# Altium footprint library PcbLibLafe.PcbLib: 294 footprints (part 17 of 19)
Each footprint in its own frame and in the unit in brackets; x right, y up, seen from the top. Pads: shape width x height; smd on the part's side, far side on the other; paste and mask are expansions set on the pad; w line width, h text height; cw(c..) or ccw(c..) is an arc to the next point about the centre after c.
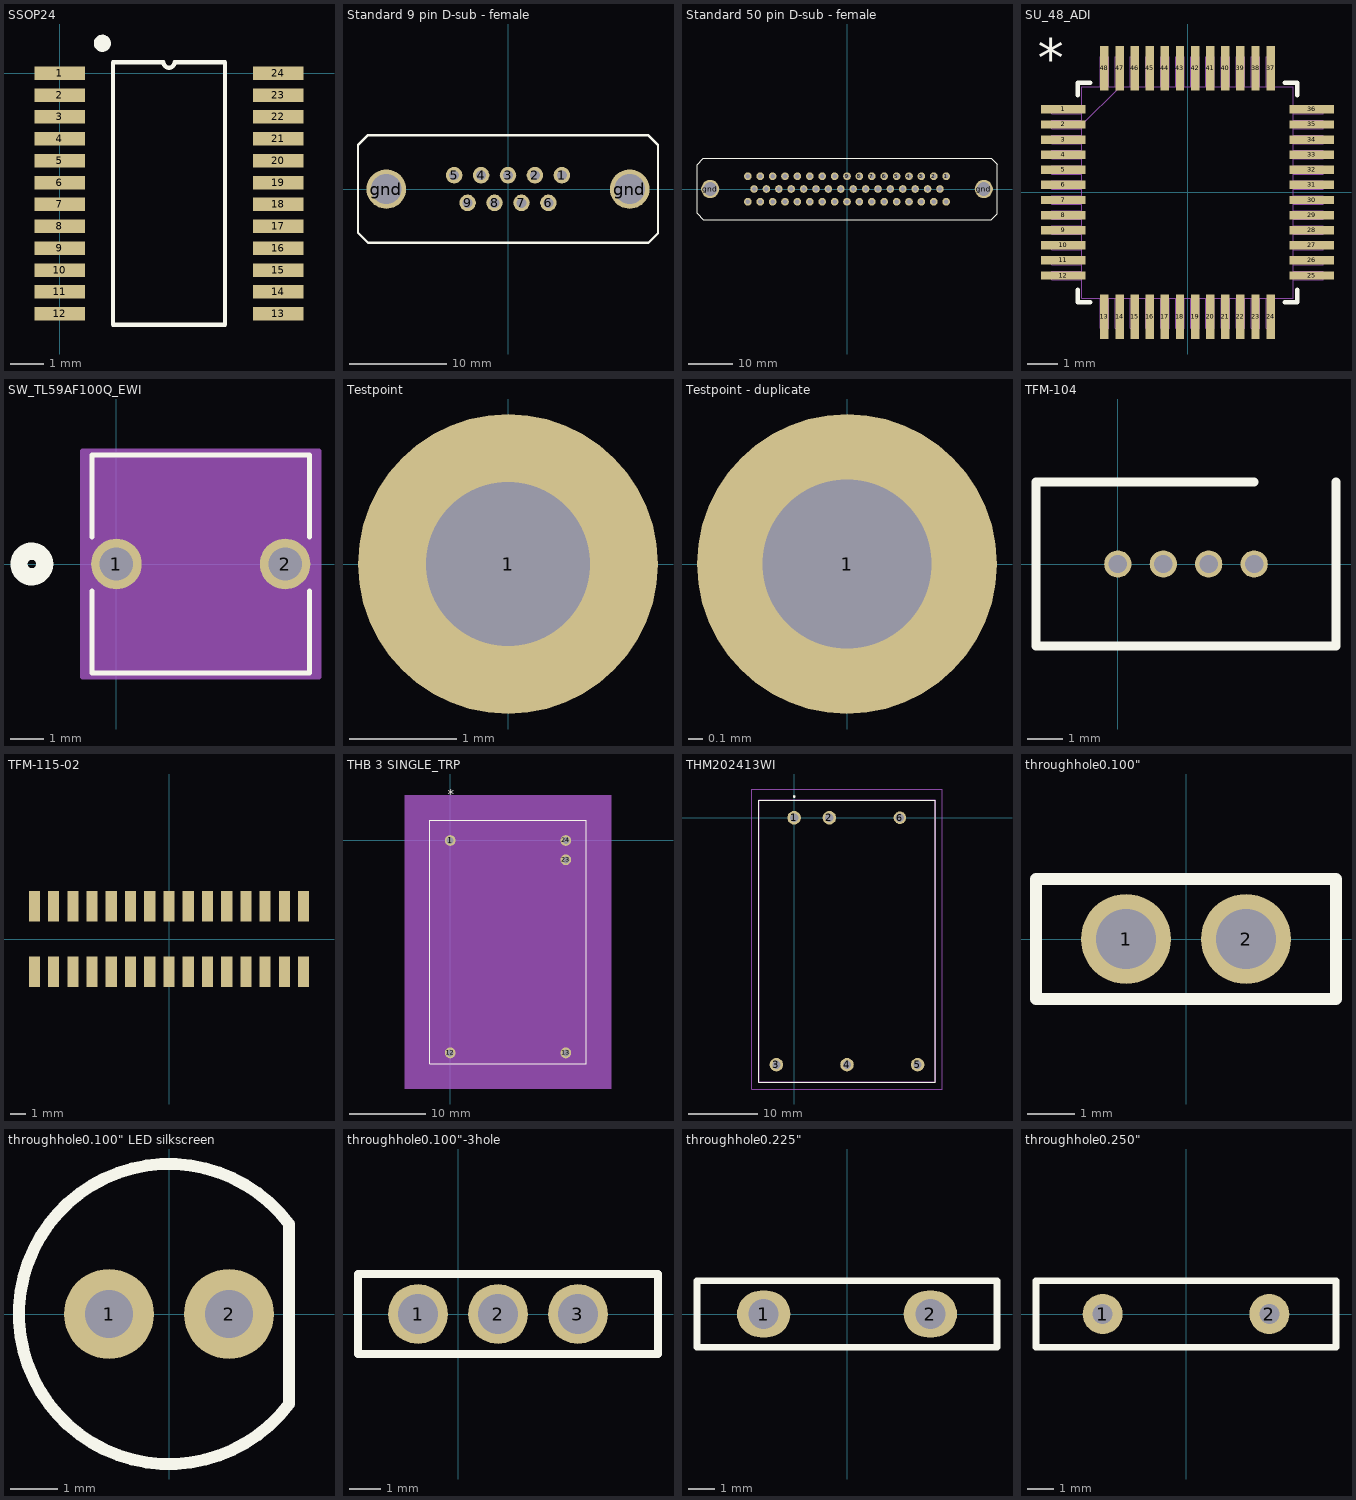
[diagram p16: the footprints below, top view; thin cyan lines are the x and y axes]

## SSOP24 [mm]
pads (24):
  rect 1.5x0.4 smd: 1(0,0) 2(0,-0.65) 3(0,-1.3) 4(0,-1.95) 5(0,-2.6) 6(0,-3.25) 7(0,-3.9) 8(0,-4.55) 9(0,-5.2) 10(0,-5.85) 11(0,-6.5) 12(0,-7.15) 13(6.5,-7.15) 14(6.5,-6.5) 15(6.5,-5.85) 16(6.5,-5.2) 17(6.5,-4.55) 18(6.5,-3.9) 19(6.5,-3.25) 20(6.5,-2.6) 21(6.5,-1.95) 22(6.5,-1.3) 23(6.5,-0.65) 24(6.5,0)
Top Overlay:
  circle w0.254: c1.27,0.889 r0.127
  lines w0.127: 1.585,-7.475 1.585,0.325 3.087,0.325 ccw(c3.25,0.325) 3.412,0.325 4.915,0.325 4.915,-7.475 1.585,-7.475
3D body: height 1.52, standoff 0.25, extent 1.067,-7.544 5.385,0.356
3D body: height 0.51, standoff 0, extent -0.076,-0.191 0.61,0.191
3D body: height 0.89, standoff 0.38, extent 0.267,-0.191 1.092,0.191
3D body: height 0.89, standoff 0.38, extent 0.267,-1.486 1.092,-1.105
3D body: height 0.51, standoff 0, extent -0.076,-1.486 0.61,-1.105
3D body: height 0.89, standoff 0.38, extent 5.359,-1.46 6.185,-1.079
3D body: height 0.51, standoff 0, extent 5.842,-1.46 6.528,-1.079
3D body: height 0.89, standoff 0.38, extent 5.359,-0.165 6.185,0.216
3D body: height 0.51, standoff 0, extent 5.842,-0.165 6.528,0.216
3D body: height 1.55, standoff 1.52, extent 1.346,-0.405 1.852,0.102
3D body: height 1.55, standoff 1.52, extent 2.159,-0.864 4.293,0
3D body: height 0.51, standoff 0, extent 5.842,-2.781 6.528,-2.4
3D body: height 0.89, standoff 0.38, extent 5.359,-2.781 6.185,-2.4
3D body: height 0.51, standoff 0, extent -0.076,-2.807 0.61,-2.426
3D body: height 0.89, standoff 0.38, extent 0.267,-2.807 1.092,-2.426
3D body: height 0.51, standoff 0, extent 5.842,-4.051 6.528,-3.67
3D body: height 0.89, standoff 0.38, extent 5.359,-4.051 6.185,-3.67
3D body: height 0.51, standoff 0, extent -0.076,-4.077 0.61,-3.696
3D body: height 0.89, standoff 0.38, extent 0.267,-4.077 1.092,-3.696
3D body: height 0.51, standoff 0, extent 5.842,-5.372 6.528,-4.991
3D body: height 0.89, standoff 0.38, extent 5.359,-5.372 6.185,-4.991
3D body: height 0.51, standoff 0, extent -0.076,-5.397 0.61,-5.016
3D body: height 0.89, standoff 0.38, extent 0.267,-5.397 1.092,-5.016
3D body: height 0.51, standoff 0, extent 5.842,-6.667 6.528,-6.286
3D body: height 0.89, standoff 0.38, extent 5.359,-6.667 6.185,-6.286
3D body: height 0.51, standoff 0, extent -0.076,-6.693 0.61,-6.312
3D body: height 0.89, standoff 0.38, extent 0.267,-6.693 1.092,-6.312
3D body: height 0.51, standoff 0, extent 5.842,-7.302 6.528,-6.921
3D body: height 0.89, standoff 0.38, extent 5.359,-7.302 6.185,-6.921
3D body: height 0.51, standoff 0, extent -0.076,-7.328 0.61,-6.947
3D body: height 0.89, standoff 0.38, extent 0.267,-7.328 1.092,-6.947
3D body: height 0.51, standoff 0, extent 5.842,-6.007 6.528,-5.626
3D body: height 0.89, standoff 0.38, extent 5.359,-6.007 6.185,-5.626
3D body: height 0.51, standoff 0, extent -0.076,-6.032 0.61,-5.651
3D body: height 0.89, standoff 0.38, extent 0.267,-6.032 1.092,-5.651
3D body: height 0.51, standoff 0, extent 5.867,-4.712 6.553,-4.331
3D body: height 0.89, standoff 0.38, extent 5.385,-4.712 6.21,-4.331
3D body: height 0.51, standoff 0, extent -0.051,-4.737 0.635,-4.356
3D body: height 0.89, standoff 0.38, extent 0.292,-4.737 1.118,-4.356
3D body: height 0.51, standoff 0, extent 5.867,-3.416 6.553,-3.035
3D body: height 0.89, standoff 0.38, extent 5.385,-3.416 6.21,-3.035
3D body: height 0.51, standoff 0, extent -0.051,-3.442 0.635,-3.061
3D body: height 0.89, standoff 0.38, extent 0.292,-3.442 1.118,-3.061
3D body: height 0.51, standoff 0, extent 5.817,-2.121 6.502,-1.74
3D body: height 0.89, standoff 0.38, extent 5.334,-2.121 6.159,-1.74
3D body: height 0.51, standoff 0, extent -0.102,-2.146 0.584,-1.765
3D body: height 0.89, standoff 0.38, extent 0.241,-2.146 1.067,-1.765
3D body: height 0.51, standoff 0, extent 5.817,-0.851 6.502,-0.47
3D body: height 0.89, standoff 0.38, extent 5.334,-0.851 6.159,-0.47
3D body: height 0.51, standoff 0, extent -0.102,-0.876 0.584,-0.495
3D body: height 0.89, standoff 0.38, extent 0.241,-0.876 1.067,-0.495

## Standard 9 pin D-sub - female [mil] "NorComp 172-E09-213R911"
height 400
pads (11):
  round 67 hole 40: 1(218,56) 2(109,56) 3(0,56) 4(-109,56) 5(-218,56) 6(163.5,-56) 7(54.5,-56) 8(-54.5,-56) 9(-163.5,-56)
  round 160 hole 122: gnd(-492,0) gnd(492,0)
Top Overlay:
  lines w10: -606.5,-176.5 -606.5,178.5 -566.5,218.5 565.5,218.5 606.5,177.5 606.5,-178.5 567,-218 -565,-218 -606.5,-176.5
3D body "172-E09-213.STEP": height 242, standoff -443.5, extent -605,-250 608,246

## Standard 50 pin D-sub - female [mil] "NorComp 172-E50-213R911"
height 400
pads (52):
  round 67 hole 40: 1(872,112) 2(763,112) 3(654,112) 4(545,112) 5(436,112) 6(327,112) 7(218,112) 8(109,112) 9(0,112) 10(-109,112) 11(-218,112) 12(-327,112) 13(-436,112) 14(-545,112) 15(-654,112) 16(-763,112) 17(-872,112) 18(817.5,0) 19(708.5,0) 20(599.5,0) 21(490.5,0) 22(381.5,0) 23(272.5,0) 24(163.5,0) 25(54.5,0) 26(-54.5,0) 27(-163.5,0) 28(-272.5,0) 29(-381.5,0) 30(-490.5,0) 31(-599.5,0) 32(-708.5,0) 33(-817.5,0) 34(872,-112) 35(763,-112) 36(654,-112) 37(545,-112) 38(436,-112) 39(327,-112) 40(218,-112) 41(109,-112) 42(0,-112) 43(-109,-112) 44(-218,-112) 45(-327,-112) 46(-436,-112) 47(-545,-112) 48(-654,-112) 49(-763,-112) 50(-872,-112)
  round 160 hole 122: gnd(-1203,0) gnd(1203,0)
Top Overlay:
  lines w10: -1319,-215 -1265.5,-268.5 1267.5,-268.5 1319,-217 1319,219 1269.5,268.5 -1263.5,268.5 -1319,213 -1319,-215
3D body "172-E50-213.STEP": height 242, standoff -443.5, extent -1323,-298 1315,304

## SU_48_ADI [mil]
pads (48):
  rect 58x11 smd paste+0 mask+0: 1(-162,108.27) 2(-162,88.58) 3(-162,68.9) 4(-162,49.21) 5(-162,29.53) 6(-162,9.84) 7(-162,-9.84) 8(-162,-29.53) 9(-162,-49.21) 10(-162,-68.9) 11(-162,-88.58) 12(-162,-108.27) 25(162,-108.27) 26(162,-88.58) 27(162,-68.9) 28(162,-49.21) 29(162,-29.53) 30(162,-9.84) 31(162,9.84) 32(162,29.53) 33(162,49.21) 34(162,68.9) 35(162,88.58) 36(162,108.27)
  rect 11x58 smd paste+0 mask+0: 13(-108.27,-162) 14(-88.58,-162) 15(-68.9,-162) 16(-49.21,-162) 17(-29.53,-162) 18(-9.84,-162) 19(9.84,-162) 20(29.53,-162) 21(49.21,-162) 22(68.9,-162) 23(88.58,-162) 24(108.27,-162) 37(108.27,162) 38(88.58,162) 39(68.9,162) 40(49.21,162) 41(29.53,162) 42(9.84,162) 43(-9.84,162) 44(-29.53,162) 45(-49.21,162) 46(-68.9,162) 47(-88.58,162) 48(-108.27,162)
Top Overlay:
  lines w6: -143,-126.87 -143,-143 -126.87,-143 ; -143,126.87 -143,143 -126.87,143 ; 126.87,-143 143,-143 143,-126.87 ; 126.87,143 143,143 143,126.87
  text "*" at -195,150 h50
Mechanical 13:
  drawing of 197 lines, arcs and shapes, not listed
3D body "SU_48_ADI.step": height 47.09, standoff 0, extent -177,-177 177.01,177.01
3D body: height 10, standoff 0, extent 0,0 10,10

## SW_TL59AF100Q_EWI [mil]
pads (2):
  round 59 / inner round 60 / far side round 59 hole 39 paste-99999 mask+0: 1(0,0) 2(196.85,0)
Top Overlay:
  circle w20: c-98.57,0 r15
  lines w6: -28.57,-31.59 -28.57,-127 225.43,-127 225.43,-31.59 ; -28.57,31.59 -28.57,127 225.43,127 225.43,31.59
Bottom Overlay:
  circle w20: c-98.57,0 r15
Mechanical 13:
  circle w20: c0,75 r15
  lines w1: -23.57,-122 -23.57,122 220.43,122 220.43,-122 -23.57,-122
Mechanical 15:
  region: 236.35,132 -39.5,132 -39.5,-132 236.35,-132
  lines w6: -39.5,-132 236.35,-132 236.35,132 -39.5,132 -39.5,-132
3D body "TL59AF100Q.STEP": height 202.44, standoff -529.84, extent -24.09,-122.05 220,122.05

## Testpoint [mil] "testpoint"
pads (1):
  round 110 hole 60: 1(0,0)

## Testpoint - duplicate [mil] "testpoint"
pads (1):
  round 80 hole 45: 1(0,0)
3D body "keystone-PN5000.STEP": height 90, standoff -210, extent -49.99,-49.99 50.01,50.01

## TFM-104 [mil] "Samtec 4 pin thru hole"
pads (4):
  round 30 hole 20: ""(0,0) ""(50,0) ""(100,0) ""(150,0)
Top Overlay:
  lines w10: 150,90 -90,90 -90,-90 240,-90 240,90

## TFM-115-02 [mil] "Samtec 30 pin surface mount"
pads (30):
  rect 29x80 smd: ""(-350,-85) ""(-350,85) ""(-300,-85) ""(-300,85) ""(-250,-85) ""(-250,85) ""(-200,-85) ""(-200,85) ""(-150,-85) ""(-150,85) ""(-100,-85) ""(-100,85) ""(-50,-85) ""(-50,85) ""(0,-85) ""(0,85) ""(50,-85) ""(50,85) ""(100,-85) ""(100,85) ""(150,-85) ""(150,85) ""(200,-85) ""(200,85) ""(250,-85) ""(250,85) ""(300,-85) ""(300,85) ""(350,-85) ""(350,85)

## THB 3 SINGLE_TRP [mil]
pads (5):
  round 56 hole 36 mask+0: 1(0,0) 12(0,-1100) 13(598.43,-1100) 23(598.43,-100) 24(598.43,0)
Top Overlay:
  lines w6: -105.29,-1157 703.71,-1157 703.71,105 -105.29,105 -105.29,-1157
  text "*" at -12.5,216.67 h50
Mechanical 5:
  region: 833.71,-1287 -235.29,-1287 -235.29,235 833.71,235
Mechanical 13:
  lines w0: 287.21,100 ccw(c299.21,100) 311.21,100
  lines w1: -100.29,-1152 698.71,-1152 698.71,100 -100.29,100 -100.29,-1152
  text "*" at -12.5,16.67 h50
Mechanical 15:
  region: 708.71,-1162 -110.29,-1162 -110.29,110 708.71,110
  region: 698.71,-1152 -100.29,-1152 -100.29,100 698.71,100
  lines w6: -110.29,-1162 -110.29,110 708.71,110 708.71,-1162 -110.29,-1162
3D body "thb3_single_3d_drawing.stp": height 413.51, standoff -153.42, extent -99.21,-1176.97 700,75
3D body: height 10, standoff 0, extent 0,0 10,10

## THM202413WI [mm]
pads (6):
  round 1.95 hole 1.2: 1(0,0) 2(5.08,0) 3(-2.54,-35.56) 4(7.62,-35.56) 5(17.78,-35.56)
  round 1.8 hole 1.2: 6(15.24,0)
Top Overlay:
  lines w0.1: -5.08,-38.06 -5.08,2.54 20.32,2.54 20.32,-38.06 -5.08,-38.06
  lines w0.2: -0.08,3.04 cw(c0.02,3.04) 0.12,3.04 cw(c0.02,3.04) -0.08,3.04
Mechanical 13:
  lines w0.2: -5.08,-38.06 -5.08,2.54 20.32,2.54 20.32,-38.06 -5.08,-38.06
Mechanical 15:
  lines w0.1: -6.08,-39.06 -6.08,4.14 21.32,4.14 21.32,-39.06 -6.08,-39.06
3D body "THM_20-2423WI.stp": height 10.91, standoff -4.89, extent -5.08,-38.07 20.32,2.53

## throughhole0.100" [mil] "0.100\" wide, 0.045\" hole diameter"
pads (2):
  round 75 hole 50: 1(-50,0) 2(50,0)
Top Overlay:
  lines w10: -125,-50 125,-50 125,50 -125,50 -125,-50

## throughhole0.100" LED silkscreen [mil] "0.100\" wide, 0.040\" hole diameter"
pads (2):
  round 75 hole 40: 1(-50,0) 2(50,0)
Top Overlay:
  lines w10: 100,-75 cw(c0,0) 100,75 100,-75

## throughhole0.100"-3hole [mil] "0.100\" wide, 0.045\" hole diameter"
pads (3):
  round 75 hole 50: 1(-50,0) 2(50,0) 3(150,0)
Top Overlay:
  lines w10: -125,-50 250,-50 250,50 -125,50 -125,-50

## throughhole0.225" [mil] "0.255\" wide, 0.045\" hole diameter"
pads (2):
  oval 80x70 hole 45: 1(-125,0) 2(125,0)
Top Overlay:
  lines w10: -225,-50 225,-50 225,50 -225,50 -225,-50
3D body "C330C105K5R5TA7301.step": height 383.2, standoff -626.29, extent -138.96,-79 140.96,81.43

## throughhole0.250" [mil] "0.250\" wide, 0.030\" hole diameter"
pads (2):
  round 60 hole 30: 1(-125,0) 2(125,0)
Top Overlay:
  lines w10: -225,-50 225,-50 225,50 -225,50 -225,-50